# Altium footprint library 13-IC Packages-1bga1.PcbLib: 72 footprints (part 2 of 6)
Each footprint in its own frame and in the unit in brackets; x right, y up, seen from the top. Pads: shape width x height; smd on the part's side, far side on the other; paste and mask are expansions set on the pad; w line width, h text height; cw(c..) or ccw(c..) is an arc to the next point about the centre after c.
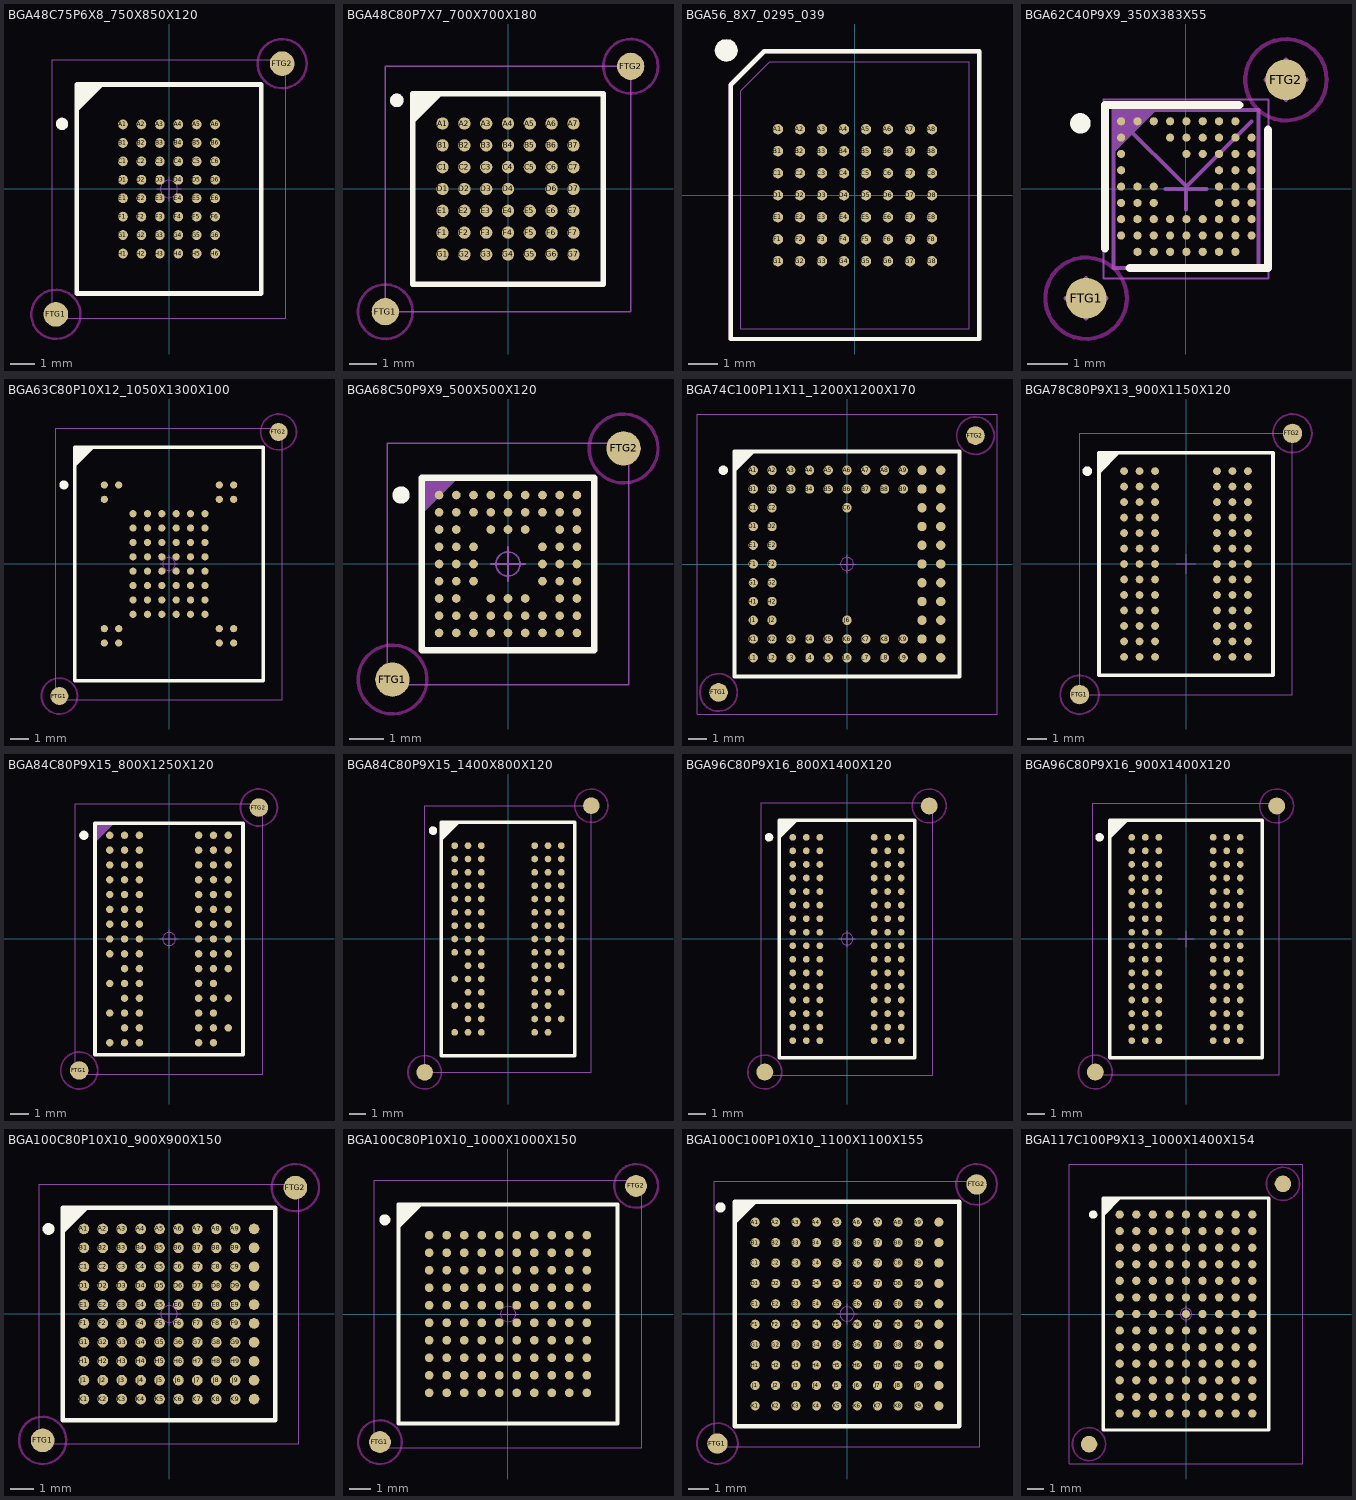
[diagram p1: the footprints below, top view; thin cyan lines are the x and y axes]

## BGA48C75P6X8_750X850X120 [mm] "BGA, 0.75mm Pitch, Rect.; 48 Pin, 6 Columns X 8 Rows, 7.50mm X 8.50mm X 1.20mm H, IPC Medium Density"
height 1.2
pads (50):
  round 0.4 smd: A1(-1.875,2.625) A2(-1.125,2.625) A3(-0.375,2.625) A4(0.375,2.625) A5(1.125,2.625) A6(1.875,2.625) B1(-1.875,1.875) B2(-1.125,1.875) B3(-0.375,1.875) B4(0.375,1.875) B5(1.125,1.875) B6(1.875,1.875) C1(-1.875,1.125) C2(-1.125,1.125) C3(-0.375,1.125) C4(0.375,1.125) C5(1.125,1.125) C6(1.875,1.125) D1(-1.875,0.375) D2(-1.125,0.375) D3(-0.375,0.375) D4(0.375,0.375) D5(1.125,0.375) D6(1.875,0.375) E1(-1.875,-0.375) E2(-1.125,-0.375) E3(-0.375,-0.375) E4(0.375,-0.375) E5(1.125,-0.375) E6(1.875,-0.375) F1(-1.875,-1.125) F2(-1.125,-1.125) F3(-0.375,-1.125) F4(0.375,-1.125) F5(1.125,-1.125) F6(1.875,-1.125) G1(-1.875,-1.875) G2(-1.125,-1.875) G3(-0.375,-1.875) G4(0.375,-1.875) G5(1.125,-1.875) G6(1.875,-1.875) H1(-1.875,-2.625) H2(-1.125,-2.625) H3(-0.375,-2.625) H4(0.375,-2.625) H5(1.125,-2.625) H6(1.875,-2.625)
  round 1 smd paste-0.51 mask+0.5: FTG1(-4.6,-5.1) FTG2(4.6,5.1)
Top Layer keep-out:
  circle w0.1: c4.6,5.1 r1
  circle w0.1: c-4.6,-5.1 r1
Top Overlay:
  circle w0.25: c-4.35,2.65 r0.125
  lines w0.2: -3.75,3.25 -2.75,4.25 ; -3.75,3.45 -2.95,4.25 ; -3.75,3.65 -3.15,4.25 ; -3.75,3.85 -3.35,4.25 ; -3.75,4.05 -3.55,4.25 ; -3.75,-4.25 -3.75,4.25 3.75,4.25 3.75,-4.25 -3.75,-4.25
Mechanical 14:
  circle w0.05: c0,0 r0.35
  lines w0.05: -0.5,0 0.5,0 ; 0,-0.5 0,0.5
  lines w0.1: -3.75,3.25 -2.75,4.25 ; -3.75,3.35 -2.85,4.25 ; -3.75,3.45 -2.95,4.25 ; -3.75,3.55 -3.05,4.25 ; -3.75,3.65 -3.15,4.25 ; -3.75,3.75 -3.25,4.25 ; -3.75,3.85 -3.35,4.25 ; -3.75,3.95 -3.45,4.25 ; -3.75,4.05 -3.55,4.25 ; -3.75,4.15 -3.65,4.25 ; -3.75,-4.25 -3.75,4.25 3.75,4.25 3.75,-4.25 -3.75,-4.25
Mechanical 15:
  lines w0.05: -4.75,-5.25 -4.75,5.25 4.75,5.25 4.75,-5.25 -4.75,-5.25
3D body "BGA48C75P6X8_750X850X120.stp": height 1.2, standoff 0, extent -3.75,-4.25 3.75,4.25

## BGA48C80P7X7_700X700X180 [mm] "BGA, 48-Leads, Body 7x7mm, Pitch 0.8mm, IPC Medium Density"
height 1.8
pads (50):
  round 0.45 smd: A1(-2.4,2.4) A2(-1.6,2.4) A3(-0.8,2.4) A4(0,2.4) A5(0.8,2.4) A6(1.6,2.4) A7(2.4,2.4) B1(-2.4,1.6) B2(-1.6,1.6) B3(-0.8,1.6) B4(0,1.6) B5(0.8,1.6) B6(1.6,1.6) B7(2.4,1.6) C1(-2.4,0.8) C2(-1.6,0.8) C3(-0.8,0.8) C4(0,0.8) C5(0.8,0.8) C6(1.6,0.8) C7(2.4,0.8) D1(-2.4,0) D2(-1.6,0) D3(-0.8,0) D4(0,0) D6(1.6,0) D7(2.4,0) E1(-2.4,-0.8) E2(-1.6,-0.8) E3(-0.8,-0.8) E4(0,-0.8) E5(0.8,-0.8) E6(1.6,-0.8) E7(2.4,-0.8) F1(-2.4,-1.6) F2(-1.6,-1.6) F3(-0.8,-1.6) F4(0,-1.6) F5(0.8,-1.6) F6(1.6,-1.6) F7(2.4,-1.6) G1(-2.4,-2.4) G2(-1.6,-2.4) G3(-0.8,-2.4) G4(0,-2.4) G5(0.8,-2.4) G6(1.6,-2.4) G7(2.4,-2.4)
  round 1 smd paste-0.51 mask+0.5: FTG1(-4.5,-4.5) FTG2(4.5,4.5)
Top Layer keep-out:
  circle w0.1: c-4.5,-4.5 r1
  circle w0.1: c4.5,4.5 r1
Top Overlay:
  circle w0.25: c-4.075,3.25 r0.125
  region: -2.5,3.5 -3.5,2.5 -3.5,3.5
  lines w0.2: -3.5,2.5 -2.5,3.5 ; -3.5,-3.5 3.5,-3.5 3.5,3.5 -3.5,3.5 -3.5,-3.5
Mechanical 14:
  circle w0.25: c-4.075,3.25 r0.125
  region: -2.5,3.5 -3.5,2.5 -3.5,3.5
  lines w0.1: -3.5,2.5 -2.5,3.5 ; -3.5,-3.5 3.5,-3.5 3.5,3.5 -3.5,3.5 -3.5,-3.5
  text "A" at -4.05,2.35 h0.4
  text "2" at -1.8,3.75 h0.4
  text "1" at -2.5,3.75 h0.4
  text "3" at -0.9,3.75 h0.4
  text "4" at -0.1,3.75 h0.4
  text "5" at 0.7,3.75 h0.4
  text "6" at 1.5,3.75 h0.4
  text "7" at 2.3,3.75 h0.4
  text "B" at -4.05,1.45 h0.4
  text "C" at -4.05,0.65 h0.4
  text "D" at -4.05,-0.15 h0.4
  text "E" at -4.05,-0.95 h0.4
  text "F" at -4.05,-1.75 h0.4
  text "G" at -4.05,-2.55 h0.4
Mechanical 15:
  lines w0.05: -4.5,-4.5 4.5,-4.5 4.5,4.5 -4.5,4.5 -4.5,-4.5
3D body "BGA48C80P7X7_700X700X180.stp": height 1.8, standoff 0, extent -3.5,-3.5 3.5,3.5

## BGA56_8X7_0295_039 [mil]
height 911.02
pads (56):
  round 14 smd: A1(-103.35,88.58) A2(-73.82,88.58) A3(-44.29,88.58) A4(-14.76,88.58) A5(14.77,88.58) A6(44.3,88.58) A7(73.83,88.58) A8(103.36,88.58) B1(-103.35,59.05) B2(-73.82,59.05) B3(-44.29,59.05) B4(-14.76,59.05) B5(14.77,59.05) B6(44.3,59.05) B7(73.83,59.05) B8(103.36,59.05) C1(-103.35,29.52) C2(-73.82,29.52) C3(-44.29,29.52) C4(-14.76,29.52) C5(14.77,29.52) C6(44.3,29.52) C7(73.83,29.52) C8(103.36,29.52) D1(-103.35,-0.01) D2(-73.82,-0.01) D3(-44.29,-0.01) D4(-14.76,-0.01) D5(14.77,-0.01) D6(44.3,-0.01) D7(73.83,-0.01) D8(103.36,-0.01) E1(-103.35,-29.54) E2(-73.82,-29.54) E3(-44.29,-29.54) E4(-14.76,-29.54) E5(14.77,-29.54) E6(44.3,-29.54) E7(73.83,-29.54) E8(103.36,-29.54) F1(-103.35,-59.07) F2(-73.82,-59.07) F3(-44.29,-59.07) F4(-14.76,-59.07) F5(14.77,-59.07) F6(44.3,-59.07) F7(73.83,-59.07) F8(103.36,-59.07) G1(-103.35,-88.6) G2(-73.82,-88.6) G3(-44.29,-88.6) G4(-14.76,-88.6) G5(14.77,-88.6) G6(44.3,-88.6) G7(73.83,-88.6) G8(103.36,-88.6)
Top Overlay:
  pour cut-out: -172.55,209.51 -178.4,208.35 -183.37,205.03 -186.68,200.07 -187.84,194.22 -186.68,188.37 -183.37,183.41 -178.4,180.09 -172.55,178.93 -166.7,180.09 -161.74,183.41 -158.42,188.37 -157.26,194.22 -158.42,200.07 -161.74,205.03 -166.7,208.35
  lines w6: -166.55,-193.14 -166.55,148.14 -121.55,193.14 166.55,193.14 166.55,-193.14 -166.55,-193.14
Mechanical 6:
  lines w6: -166.55,-193.14 -166.55,148.14 -121.55,193.14 166.55,193.14 166.55,-193.14 -166.55,-193.14
Mechanical 16:
  lines w1: -153.55,-179.14 -153.55,140.14 -114.55,179.14 153.55,179.14 153.55,-179.14 -153.55,-179.14
Mechanical 18:
  text "F7" at 73.83,-68.67 h12
  text "E6" at 44.3,-39.14 h12
  text "E5" at 14.77,-39.14 h12
  text "G5" at 14.77,-98.2 h12
  text "E4" at -14.76,-39.14 h12
  text "G3" at -44.29,-98.2 h12
  text "E3" at -44.29,-39.14 h12
  text "G1" at -103.35,-98.2 h12
  text "G7" at 73.83,-98.2 h12
  text "F6" at 44.3,-68.67 h12
  text "F5" at 14.77,-68.67 h12
  text "F4" at -14.76,-68.67 h12
  text "D5" at 14.77,-9.61 h12
  text "F3" at -44.29,-68.67 h12
  text "F2" at -73.82,-68.67 h12
  text "E2" at -73.82,-39.14 h12
  text "E8" at 103.36,-39.14 h12
  text "D8" at 103.36,-9.61 h12
  text "C8" at 103.36,19.92 h12
  text "B8" at 103.36,49.45 h12
  text "A8" at 103.36,78.98 h12
  text "B7" at 73.83,49.45 h12
  text "A7" at 73.83,78.98 h12
  text "C7" at 73.83,19.92 h12
  text "A2" at -73.82,78.98 h12
  text "B2" at -73.82,49.45 h12
  text "C2" at -73.82,19.92 h12
  text "A1" at -103.35,78.98 h12
  text "B1" at -103.35,49.45 h12
  text "C1" at -103.35,19.92 h12
  text "D2" at -73.82,-9.61 h12
  text "D1" at -103.35,-9.61 h12
  text "D4" at -14.76,-9.61 h12
  text "B6" at 44.3,49.45 h12
  text "C5" at 14.77,19.92 h12
  text "F8" at 103.36,-68.67 h12
  text "A4" at -14.76,78.98 h12
  text "G6" at 44.3,-98.2 h12
  text "E1" at -103.35,-39.14 h12
  text "G4" at -14.76,-98.2 h12
  text "A5" at 14.77,78.98 h12
  text "F1" at -103.35,-68.67 h12
  text "A3" at -44.29,78.98 h12
  text "G2" at -73.82,-98.2 h12
  text "G8" at 103.36,-98.2 h12
  text "A6" at 44.3,78.98 h12
  text "C6" at 44.3,19.92 h12
  text "B3" at -44.29,49.45 h12
  text "D3" at -44.29,-9.61 h12
  text "C3" at -44.29,19.92 h12
  text "D7" at 73.83,-9.61 h12
  text "C4" at -14.76,19.92 h12
  text "D6" at 44.3,-9.61 h12
  text "B5" at 14.77,49.45 h12
  text "E7" at 73.83,-39.14 h12
  text "B4" at -14.76,49.45 h12

## BGA62C40P9X9_350X383X55 [mm] "BGA, 0.40mm Pitch, Rect.; 62 Pin, 9 Columns X 9 Rows, 3.50mm X 3.83mm X 0.55mm H"
height 0.55
pads (64):
  round 0.2 smd: A1(-1.59,1.66) A2(-1.19,1.66) A3(-0.79,1.66) A4(-0.39,1.66) A5(0.01,1.66) A6(0.41,1.66) A7(0.81,1.66) A8(1.21,1.66) B1(-1.59,1.26) B4(-0.39,1.26) B5(0.01,1.26) B6(0.41,1.26) B7(0.81,1.26) B8(1.21,1.26) B9(1.61,1.26) C1(-1.59,0.86) C5(0.01,0.86) C6(0.41,0.86) C7(0.81,0.86) C8(1.21,0.86) C9(1.61,0.86) D1(-1.59,0.46) D7(0.81,0.46) D8(1.21,0.46) D9(1.61,0.46) E1(-1.59,0.06) E2(-1.19,0.06) E3(-0.79,0.06) E7(0.81,0.06) E8(1.21,0.06) E9(1.61,0.06) F1(-1.59,-0.34) F2(-1.19,-0.34) F3(-0.79,-0.34) F7(0.81,-0.34) F8(1.21,-0.34) F9(1.61,-0.34) G1(-1.59,-0.74) G2(-1.19,-0.74) G3(-0.79,-0.74) G4(-0.39,-0.74) G5(0.01,-0.74) G6(0.41,-0.74) G7(0.81,-0.74) G8(1.21,-0.74) G9(1.61,-0.74) H1(-1.59,-1.14) H2(-1.19,-1.14) H3(-0.79,-1.14) H4(-0.39,-1.14) H5(0.01,-1.14) H6(0.41,-1.14) H7(0.81,-1.14) H8(1.21,-1.14) H9(1.61,-1.14) J2(-1.19,-1.54) J3(-0.79,-1.54) J4(-0.39,-1.54) J5(0.01,-1.54) J6(0.41,-1.54) J7(0.81,-1.54) J8(1.21,-1.54)
  round 1 smd paste-0.51 mask+0.5: FTG1(-2.45,-2.678) FTG2(2.45,2.678)
Top Layer keep-out:
  circle w0.1: c2.45,2.678 r1
  circle w0.1: c-2.45,-2.678 r1
Top Overlay:
  circle w0.25: c-2.59,1.61 r0.125
  lines w0.2: -1.99,-1.462 -1.99,2.06 1.306,2.06 ; -1.38,-1.94 2.01,-1.94 2.01,1.455
Mechanical 8:
  lines w0.1: -2.95,-2.678 -2.45,-2.678 ; -2.45,-3.178 -2.45,-2.678 ; -2.45,-2.178 -2.45,-2.678 ; -1.95,-2.678 -2.45,-2.678 ; -1.59,1.66 0.01,0.06 1.61,1.66 ; -0.5,0 0,0 ; 0,-0.5 0,0 ; 0.5,0 0,0 ; 1.95,2.678 2.45,2.678 ; 2.45,2.178 2.45,2.678 ; 2.45,3.178 2.45,2.678 ; 2.95,2.678 2.45,2.678
Mechanical 14:
  lines w0.1: -1.775,0.945 -0.775,1.945 ; -1.775,1.045 -0.875,1.945 ; -1.775,1.145 -0.975,1.945 ; -1.775,1.245 -1.075,1.945 ; -1.775,1.345 -1.175,1.945 ; -1.775,1.445 -1.275,1.945 ; -1.775,1.545 -1.375,1.945 ; -1.775,1.645 -1.475,1.945 ; -1.775,1.745 -1.575,1.945 ; -1.775,1.845 -1.675,1.945 ; -1.775,-1.94 1.775,-1.94 1.775,1.94 -1.775,1.94 -1.775,-1.94
Mechanical 15:
  lines w0.05: -2.025,-2.19 2.025,-2.19 2.025,2.19 -2.025,2.19 -2.025,-2.19
3D body "BGA62C40P9X9_350X383X55.stp": height 0.55, standoff 0, extent -1.775,-1.94 1.775,1.94

## BGA63C80P10X12_1050X1300X100 [mm] "BGA, 0.80mm pitch, Rect.; 63 Pin, 10 Columns X 12 Rows, 10.50mm X 13.00mm X 1.00mm H"
height 1
pads (65):
  round 0.4 smd: A1(-3.6,4.4) A2(-2.8,4.4) A9(2.8,4.4) A10(3.6,4.4) B1(-3.6,3.6) B9(2.8,3.6) B10(3.6,3.6) C3(-2,2.8) C4(-1.2,2.8) C5(-0.4,2.8) C6(0.4,2.8) C7(1.2,2.8) C8(2,2.8) D3(-2,2) D4(-1.2,2) D5(-0.4,2) D6(0.4,2) D7(1.2,2) D8(2,2) E3(-2,1.2) E4(-1.2,1.2) E5(-0.4,1.2) E6(0.4,1.2) E7(1.2,1.2) E8(2,1.2) F3(-2,0.4) F4(-1.2,0.4) F5(-0.4,0.4) F6(0.4,0.4) F7(1.2,0.4) F8(2,0.4) G3(-2,-0.4) G4(-1.2,-0.4) G5(-0.4,-0.4) G6(0.4,-0.4) G7(1.2,-0.4) G8(2,-0.4) H3(-2,-1.2) H4(-1.2,-1.2) H5(-0.4,-1.2) H6(0.4,-1.2) H7(1.2,-1.2) H8(2,-1.2) J3(-2,-2) J4(-1.2,-2) J5(-0.4,-2) J6(0.4,-2) J7(1.2,-2) J8(2,-2) K3(-2,-2.8) K4(-1.2,-2.8) K5(-0.4,-2.8) K6(0.4,-2.8) K7(1.2,-2.8) K8(2,-2.8) L1(-3.6,-3.6) L2(-2.8,-3.6) L9(2.8,-3.6) L10(3.6,-3.6) M1(-3.6,-4.4) M2(-2.8,-4.4) M9(2.8,-4.4) M10(3.6,-4.4)
  round 1 smd paste-0.51 mask+0.5: FTG1(-6.1,-7.35) FTG2(6.1,7.35)
Top Layer keep-out:
  circle w0.1: c6.1,7.35 r1
  circle w0.1: c-6.1,-7.35 r1
Top Overlay:
  circle w0.25: c-5.85,4.4 r0.125
  lines w0.2: -5.25,5.5 -4.25,6.5 ; -5.25,5.7 -4.45,6.5 ; -5.25,5.9 -4.65,6.5 ; -5.25,6.1 -4.85,6.5 ; -5.25,6.3 -5.05,6.5 ; -5.25,-6.5 5.25,-6.5 5.25,6.5 -5.25,6.5 -5.25,-6.5
Mechanical 14:
  lines w0.1: -5.25,5.5 -4.25,6.5 ; -5.25,5.6 -4.35,6.5 ; -5.25,5.7 -4.45,6.5 ; -5.25,5.8 -4.55,6.5 ; -5.25,5.9 -4.65,6.5 ; -5.25,6 -4.75,6.5 ; -5.25,6.1 -4.85,6.5 ; -5.25,6.2 -4.95,6.5 ; -5.25,6.3 -5.05,6.5 ; -5.25,6.4 -5.15,6.5 ; -5.25,-6.5 5.25,-6.5 5.25,6.5 -5.25,6.5 -5.25,-6.5
Mechanical 15:
  circle w0.05: c0,0 r0.35
  lines w0.05: -0.5,0 0.5,0 ; 0,-0.5 0,0.5 ; -6.3,-7.55 6.3,-7.55 6.3,7.55 -6.3,7.55 -6.3,-7.55
3D body "BGA63C80P10X12_1050X1300X100.stp": height 1, standoff 0, extent -5.25,-6.5 5.25,6.5

## BGA68C50P9X9_500X500X120 [mm] "BGA, 0.50mm Pitch, Square; 68 Pin, 9 Columns X 9 Rows, 5.00mm X 5.00mm X 1.20mm H"
height 1.2
pads (70):
  round 0.25 smd: A1(-2,2) A2(-1.5,2) A3(-1,2) A4(-0.5,2) A5(0,2) A6(0.5,2) A7(1,2) A8(1.5,2) A9(2,2) B1(-2,1.5) B2(-1.5,1.5) B3(-1,1.5) B4(-0.5,1.5) B5(0,1.5) B6(0.5,1.5) B7(1,1.5) B8(1.5,1.5) B9(2,1.5) C1(-2,1) C2(-1.5,1) C4(-0.5,1) C5(0,1) C6(0.5,1) C8(1.5,1) C9(2,1) D1(-2,0.5) D2(-1.5,0.5) D3(-1,0.5) D7(1,0.5) D8(1.5,0.5) D9(2,0.5) E1(-2,0) E2(-1.5,0) E3(-1,0) E7(1,0) E8(1.5,0) E9(2,0) F1(-2,-0.5) F2(-1.5,-0.5) F3(-1,-0.5) F7(1,-0.5) F8(1.5,-0.5) F9(2,-0.5) G1(-2,-1) G2(-1.5,-1) G4(-0.5,-1) G5(0,-1) G6(0.5,-1) G8(1.5,-1) G9(2,-1) H1(-2,-1.5) H2(-1.5,-1.5) H3(-1,-1.5) H4(-0.5,-1.5) H5(0,-1.5) H6(0.5,-1.5) H7(1,-1.5) H8(1.5,-1.5) H9(2,-1.5) J1(-2,-2) J2(-1.5,-2) J3(-1,-2) J4(-0.5,-2) J5(0,-2) J6(0.5,-2) J7(1,-2) J8(1.5,-2) J9(2,-2)
  round 1 smd paste-0.51 mask+0.5: FTG1(-3.35,-3.35) FTG2(3.35,3.35)
Top Layer keep-out:
  circle w0.1: c-3.35,-3.35 r1
  circle w0.1: c3.35,3.35 r1
Top Overlay:
  circle w0.25: c-3.1,2 r0.125
  lines w0.2: -2.5,-2.5 2.5,-2.5 2.5,2.5 -2.5,2.5 -2.5,-2.5
Mechanical 14:
  lines w0.1: -2.5,1.5 -1.5,2.5 ; -2.5,1.6 -1.6,2.5 ; -2.5,1.7 -1.7,2.5 ; -2.5,1.8 -1.8,2.5 ; -2.5,1.9 -1.9,2.5 ; -2.5,2 -2,2.5 ; -2.5,2.1 -2.1,2.5 ; -2.5,2.2 -2.2,2.5 ; -2.5,2.3 -2.3,2.5 ; -2.5,2.4 -2.4,2.5 ; -2.5,-2.5 2.5,-2.5 2.5,2.5 -2.5,2.5 -2.5,-2.5
  text "9" at 1.9,2.8 h0.4
  text "1" at -2.1,2.8 h0.4
  text "J" at -3,-2.2 h0.4
  text "A" at -3.2,2.5 h0.4
Mechanical 15:
  circle w0.05: c0,0 r0.35
  lines w0.05: -0.5,0 0.5,0 ; 0,-0.5 0,0.5 ; -3.5,-3.5 3.5,-3.5 3.5,3.5 -3.5,3.5 -3.5,-3.5
3D body "BGA68C50P9X9_500X500X120.stp": height 1.15, standoff 0, extent -2.5,-2.5 2.5,2.5

## BGA74C100P11X11_1200X1200X170 [mm] "BGA, 1.00mm Pitch, Square; 74 Pin, 11 Columns X 11 Rows, 12.00mm X 12.00mm X 1.70mm H"
height 1.7
pads (76):
  round 0.5 smd: A1(-5,5) A2(-4,5) A3(-3,5) A4(-2,5) A5(-1,5) A6(0,5) A7(1,5) A8(2,5) A9(3,5) A10(4,5) A11(5,5) B1(-5,4) B2(-4,4) B3(-3,4) B4(-2,4) B5(-1,4) B6(0,4) B7(1,4) B8(2,4) B9(3,4) B10(4,4) B11(5,4) C1(-5,3) C2(-4,3) C6(0,3) C10(4,3) C11(5,3) D1(-5,2) D2(-4,2) D10(4,2) D11(5,2) E1(-5,1) E2(-4,1) E10(4,1) E11(5,1) F1(-5,0) F2(-4,0) F10(4,0) F11(5,0) G1(-5,-1) G2(-4,-1) G10(4,-1) G11(5,-1) H1(-5,-2) H2(-4,-2) H10(4,-2) H11(5,-2) J1(-5,-3) J2(-4,-3) J6(0,-3) J10(4,-3) J11(5,-3) K1(-5,-4) K2(-4,-4) K3(-3,-4) K4(-2,-4) K5(-1,-4) K6(0,-4) K7(1,-4) K8(2,-4) K9(3,-4) K10(4,-4) K11(5,-4) L1(-5,-5) L2(-4,-5) L3(-3,-5) L4(-2,-5) L5(-1,-5) L6(0,-5) L7(1,-5) L8(2,-5) L9(3,-5) L10(4,-5) L11(5,-5)
  round 1 smd paste-0.51 mask+0.5: FTG1(-6.85,-6.85) FTG2(6.85,6.85)
Top Layer keep-out:
  circle w0.1: c6.85,6.85 r1
  circle w0.1: c-6.85,-6.85 r1
Top Overlay:
  circle w0.25: c-6.6,5 r0.125
  lines w0.2: -6,5 -5,6 ; -6,5.2 -5.2,6 ; -6,5.4 -5.4,6 ; -6,5.6 -5.6,6 ; -6,5.8 -5.8,6 ; -6,-6 -6,6 6,6 6,-6 -6,-6
Mechanical 14:
  text "1" at -4.575,6.5 h0.6
  text "6" at 0.375,6.5 h0.6
  text "7" at 1.375,6.5 h0.6
  text "8" at 2.35,6.5 h0.6
  text "9" at 3.425,6.5 h0.6
  text "10" at 4.225,6.5 h0.6
  text "11" at 5.275,6.5 h0.6
  text "5" at -0.625,6.5 h0.6
  text "4" at -1.625,6.5 h0.6
  text "3" at -2.625,6.5 h0.6
  text "2" at -3.625,6.5 h0.6
  text "A" at -6.9,4.7 h0.6
  text "B" at -6.9,3.7 h0.6
  text "C" at -6.9,2.7 h0.6
  text "D" at -6.9,1.7 h0.6
  text "E" at -6.9,0.7 h0.6
  text "F" at -6.9,-0.3 h0.6
  text "G" at -6.9,-1.3 h0.6
  text "H" at -6.9,-2.3 h0.6
  text "J" at -6.9,-3.3 h0.6
  text "K" at -6.9,-4.3 h0.6
  text "L" at -6.9,-5.3 h0.6
Mechanical 15:
  circle w0.05: c0,0 r0.35
  lines w0.05: -0.5,0 0.5,0 ; 0,-0.5 0,0.5 ; -8,-8 -8,8 8,8 8,-8 -8,-8
  lines w0.1: -6,5 -5,6 ; -6,5.1 -5.1,6 ; -6,5.2 -5.2,6 ; -6,5.3 -5.3,6 ; -6,5.4 -5.4,6 ; -6,5.5 -5.5,6 ; -6,5.6 -5.6,6 ; -6,5.7 -5.7,6 ; -6,5.8 -5.8,6 ; -6,5.9 -5.9,6 ; -6,-6 -6,6 6,6 6,-6 -6,-6
3D body "BGA74C100P11X11_1200X1200X170.stp": height 1.7, standoff 0, extent -6,-6 6,6
